# Altium footprint library PcbLib.PcbLib: 428 footprints (part 25 of 27)
Each footprint in its own frame and in the unit in brackets; x right, y up, seen from the top. Pads: shape width x height; smd on the part's side, far side on the other; paste and mask are expansions set on the pad; w line width, h text height; cw(c..) or ccw(c..) is an arc to the next point about the centre after c.
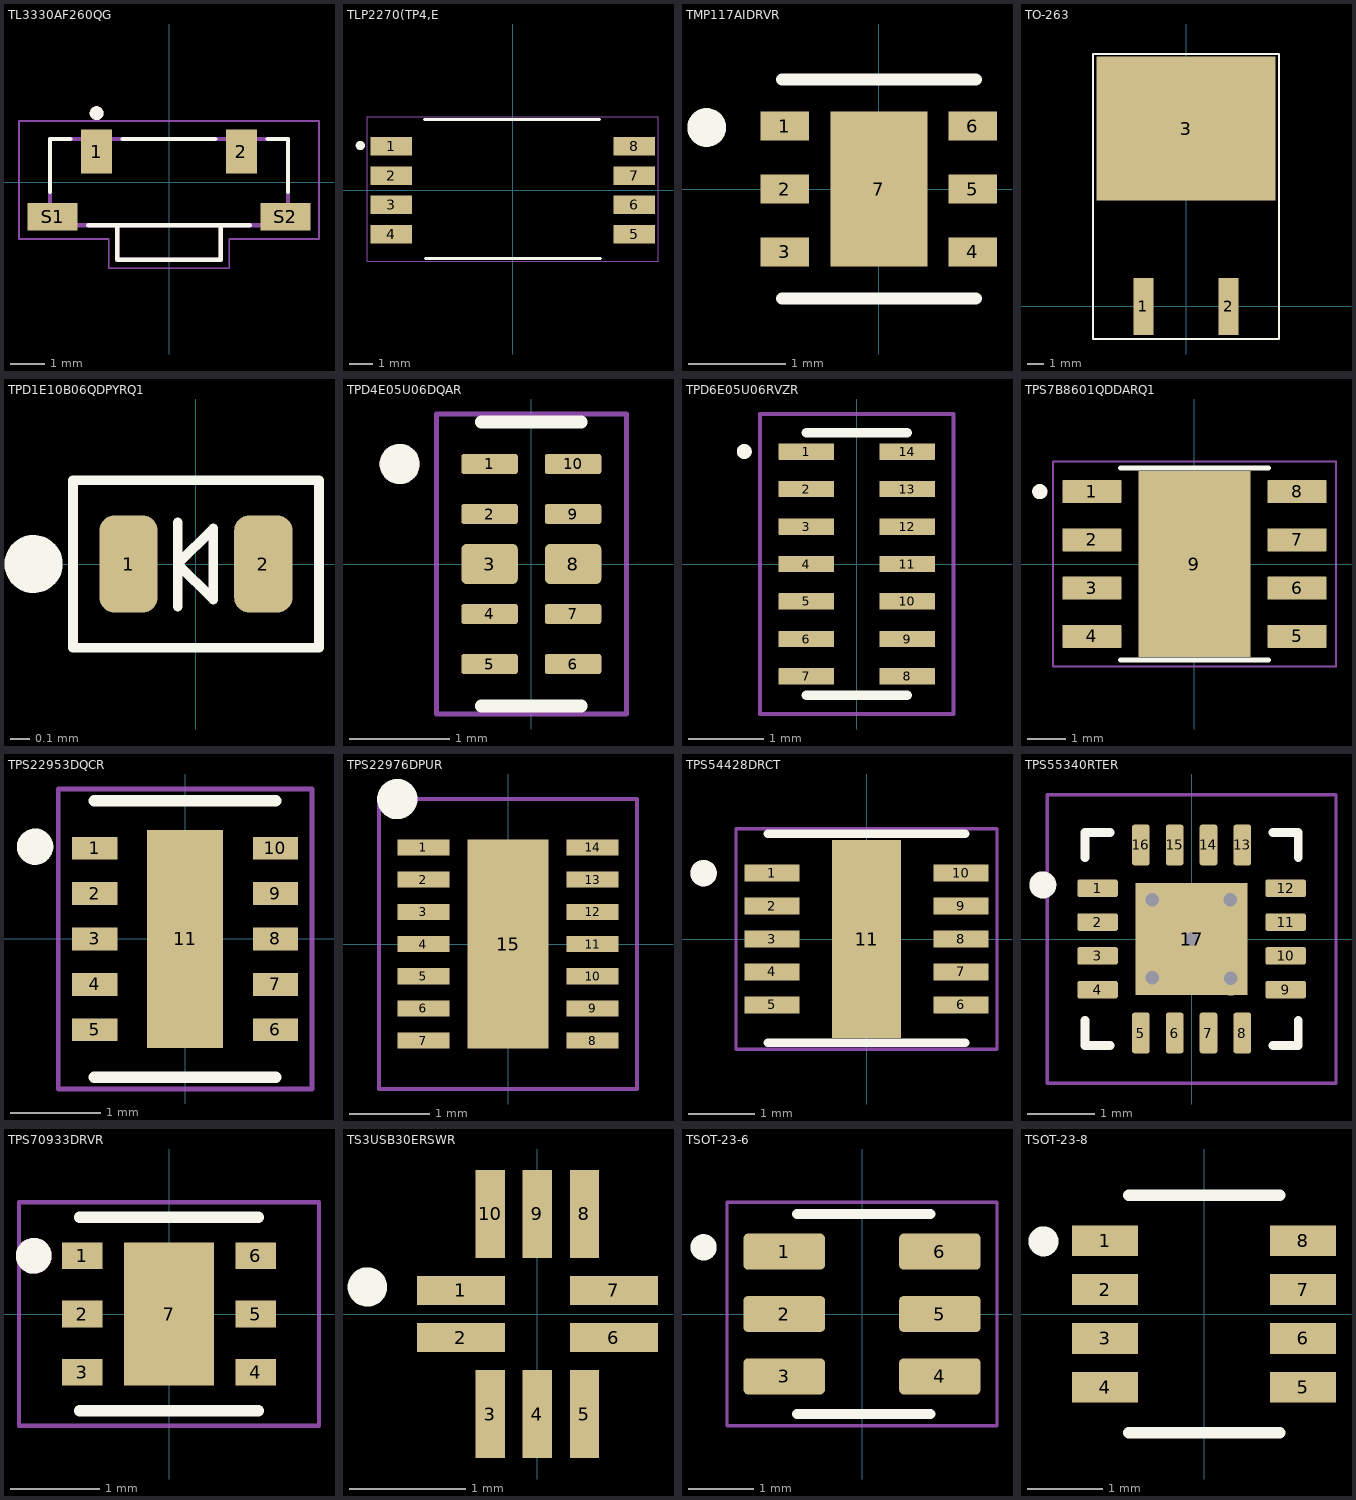
[diagram p24: the footprints below, top view; thin cyan lines are the x and y axes]

## TL3330AF260QG [mm]
height 3.4
pads (4):
  rect 0.9x1.27 smd: 1(-2.1,0.885) 2(2.1,0.885)
  rect 1.45x0.8 smd: S1(-3.375,-1) S2(3.375,-1)
Top Overlay:
  circle w0.2: c-2.1,2 r0.1
  lines w0.127: -3.45,-0.286 -3.45,1.25 -2.863,1.25 ; -2.337,-1.25 -1.5,-1.25 ; -1.336,1.25 1.336,1.25 ; 2.337,-1.25 1.5,-1.25 ; 2.863,1.25 3.45,1.25 3.45,-0.286 ; -1.5,-1.25 -1.5,-2.25 1.5,-2.25 1.5,-1.25 ; -1.5,-1.25 1.5,-1.25
Mechanical 13:
  circle w0.2: c-2.1,2 r0.1
  lines w0.127: -1.5,-1.25 -1.5,-2.25 1.5,-2.25 1.5,-1.25 ; -1.5,-1.25 1.5,-1.25 ; -1.5,-1.25 -3.45,-1.25 -3.45,1.25 3.45,1.25 3.45,-1.25 1.5,-1.25
Mechanical 15:
  lines w0.05: -4.35,-1.65 -1.75,-1.65 -1.75,-2.5 1.75,-2.5 1.75,-1.65 4.35,-1.65 4.35,1.77 -4.35,1.77 -4.35,-1.65
3D body "step_temp.STEP": height 3.5, standoff 0, extent -3.9,-2.25 3.9,1.259

## TLP2270(TP4,E [mm]
pads (8):
  rect 1.8x0.8 smd: 1(-5.275,1.905) 2(-5.275,0.635) 3(-5.275,-0.635) 4(-5.275,-1.905) 5(5.275,-1.905) 6(5.275,-0.635) 7(5.275,0.635) 8(5.275,1.905)
Top Overlay:
  circle w0.2: c-6.61,1.94 r0.1
  lines w0.127: -3.83,3.06 3.77,3.06 ; -3.79,-2.95 3.81,-2.95
Mechanical 15:
  lines w0.05: -6.31,-3.08 -6.31,3.19 6.3,3.19 6.3,-3.08 -6.31,-3.08
3D body "TLP2270_TP4,E.stp": height 2.2, standoff 0, extent -5.475,-2.875 5.575,2.975

## TMP117AIDRVR [mm]
pads (7):
  rect 0.5x0.3 smd: 1(-0.97,0.65) 2(-0.97,0) 3(-0.97,-0.65) 4(0.97,-0.65) 5(0.97,0) 6(0.97,0.65)
  rect 1x1.6 smd paste-2: 7(0,0)
Top Overlay:
  circle w0.2: c-1.778,0.635 r0.1
  lines w0.127: -1,-1.13 1,-1.13 ; -1,1.13 1,1.13
Top Paste:
  region: 0.316,-0.506 -0.316,-0.506 -0.316,0.506 0.316,0.506
3D body "step_temp.STEP": height 0.8, standoff 0, extent -1,-1 1,1

## TO-263 [mm]
pads (3):
  rect 1.2x3.4 smd: 1(-2.54,0) 2(2.54,0)
  rect 10.7x8.6 smd: 3(0,10.6)
Top Overlay:
  lines w0.127: -5.55,-1.95 5.55,-1.95 5.55,15.05 -5.55,15.05 -5.55,-1.95
3D body "IRF1407STRLPBF.STEP": height 4.83, standoff -0.25, extent -5.03,-0.635 5.13,14.605

## TPD1E10B06QDPYRQ1 [mm]
pads (2):
  rrect50% 0.3x0.5 smd paste-0.015 mask+0.07: 1(-0.348,0) 2(0.348,0)
Top Overlay:
  circle w0.15: c-0.838,0 r0.075
  lines w0.05: -0.094,-0.22 -0.094,0.216 ; -0.635,-0.432 0.635,-0.432 0.635,0.432 -0.635,0.432 -0.635,-0.432 ; -0.094,0 0.09,0.184 0.09,-0.184 -0.094,0
3D body "step_temp.STEP": height 0.45, standoff 0, extent -0.5,-0.3 0.5,0.3

## TPD4E05U06DQAR [mm]
height 0.55
pads (10):
  rrect25% 0.565x0.2 smd: 1(-0.417,1) 2(-0.417,0.5) 4(-0.417,-0.5) 5(-0.417,-1) 6(0.417,-1) 7(0.417,-0.5) 9(0.417,0.5) 10(0.417,1)
  rrect25% 0.565x0.4 smd: 3(-0.417,0) 8(0.417,0)
Top Overlay:
  circle w0.2: c-1.318,1 r0.1
  lines w0.127: -0.5,-1.42 0.5,-1.42 ; -0.5,1.42 0.5,1.42
Mechanical 13:
  circle w0.2: c-1.318,1 r0.1
Mechanical 15:
  lines w0.05: -0.95,-1.5 0.95,-1.5 0.95,1.5 -0.95,1.5 -0.95,-1.5
3D body "step_temp.STEP": height 0.55, standoff 0, extent -0.5,-1.25 0.5,1.25

## TPD6E05U06RVZR [mm]
pads (14):
  rrect6% 0.74x0.22 smd: 1(-0.67,1.5) 2(-0.67,1) 3(-0.67,0.5) 4(-0.67,0) 5(-0.67,-0.5) 6(-0.67,-1) 7(-0.67,-1.5) 8(0.67,-1.5) 9(0.67,-1) 10(0.67,-0.5) 11(0.67,0) 12(0.67,0.5) 13(0.67,1) 14(0.67,1.5)
Top Overlay:
  circle w0.1: c-1.5,1.5 r0.05
  lines w0.127: -0.675,-1.75 0.675,-1.75 ; -0.675,1.75 0.675,1.75
Mechanical 15:
  lines w0.05: -1.29,-2 1.29,-2 1.29,2 -1.29,2 -1.29,-2
3D body "step_temp.STEP": height 0.55, standoff 0, extent -0.675,-1.75 0.675,1.75

## TPS7B8601QDDARQ1 [mm]
pads (9):
  rrect5% 1.55x0.6 smd mask+0: 1(-2.7,1.905) 2(-2.7,0.635) 3(-2.7,-0.635) 4(-2.7,-1.905) 5(2.7,-1.905) 6(2.7,-0.635) 7(2.7,0.635) 8(2.7,1.905)
  rect 2.95x4.9 smd paste-3 mask+0: 9(0,0)
Top Overlay:
  circle w0.2: c-4.07,1.905 r0.1
  lines w0.127: -1.95,-2.525 1.95,-2.525 ; -1.95,2.525 1.95,2.525
Top Paste:
  region: 1.355,-1.7 -1.355,-1.7 -1.355,1.7 1.355,1.7
Top Solder:
  drawing of 9 lines, arcs and shapes, not listed
Mechanical 15:
  lines w0.05: -3.725,-2.7 -3.725,2.7 3.725,2.7 3.725,-2.7 -3.725,-2.7
3D body "step_temp.STEP": height 1.7, standoff 0, extent -3,-2.45 3,2.45

## TPS22953DQCR [mm]
pads (11):
  rect 0.5x0.25 smd: 1(-0.995,1) 2(-0.995,0.5) 3(-0.995,0) 4(-0.995,-0.5) 5(-0.995,-1) 6(0.995,-1) 7(0.995,-0.5) 8(0.995,0) 9(0.995,0.5) 10(0.995,1)
  rect 0.84x2.4 smd paste-2: 11(0,0)
Top Overlay:
  circle w0.2: c-1.651,1.016 r0.1
  lines w0.127: -1,-1.52 1,-1.52 ; -1,1.52 1,1.52
Top Paste:
  region: 0.265,-0.76 -0.265,-0.76 -0.265,0.76 0.265,0.76
Mechanical 15:
  lines w0.05: -1.397,-1.651 -1.397,1.651 1.397,1.651 1.397,-1.651 -1.397,-1.651
3D body "TPS22953DQCR.STEP": height 0.8, standoff 0, extent -1,-1.501 1,1.499

## TPS22976DPUR [mm]
pads (15):
  rect 0.65x0.2 smd: 1(-1.05,1.2) 2(-1.05,0.8) 3(-1.05,0.4) 4(-1.05,0) 5(-1.05,-0.4) 6(-1.05,-0.8) 7(-1.05,-1.2) 8(1.05,-1.2) 9(1.05,-0.8) 10(1.05,-0.4) 11(1.05,0) 12(1.05,0.4) 13(1.05,0.8) 14(1.05,1.2)
  rect 1x2.6 smd: 15(0,0)
Top Overlay:
  circle w0.25: c-1.375,1.8 r0.125
Mechanical 15:
  lines w0.05: -1.6,-1.8 -1.6,1.8 1.6,1.8 1.6,-1.8 -1.6,-1.8
3D body "TPS22976DPUR.stp": height 0.8, standoff 0, extent -1.05,-1.5 1.05,1.5

## TPS54428DRCT [mm]
pads (11):
  rect 0.84x0.26 smd: 1(-1.435,1) 2(-1.435,0.5) 3(-1.435,0) 4(-1.435,-0.5) 5(-1.435,-1) 6(1.435,-1) 7(1.435,-0.5) 8(1.435,0) 9(1.435,0.5) 10(1.435,1)
  rect 1.05x3.01 smd paste-3: 11(0,0)
Top Overlay:
  circle w0.2: c-2.475,1 r0.1
  lines w0.127: -1.501,-1.575 1.499,-1.575 ; -1.501,1.6 1.499,1.6
Top Paste:
  region: 0.33,-0.95 -0.33,-0.95 -0.33,0.95 0.33,0.95
Mechanical 13:
  circle w0.2: c-2.475,1 r0.1
Mechanical 15:
  lines w0.05: -1.981,-1.676 -1.981,1.676 1.981,1.676 1.981,-1.676 -1.981,-1.676
3D body "step_temp.STEP": height 1, standoff 0, extent -1.5,-1.5 1.5,1.5

## TPS55340RTER [mm]
pads (17):
  rrect25% 0.6x0.26 smd: 1(-1.39,0.75) 2(-1.39,0.25) 3(-1.39,-0.25) 4(-1.39,-0.75) 9(1.39,-0.75) 10(1.39,-0.25) 11(1.39,0.25) 12(1.39,0.75)
  rrect25% 0.26x0.6 smd: 5(-0.75,-1.39) 6(-0.25,-1.39) 7(0.25,-1.39) 8(0.75,-1.39) 13(0.75,1.39) 14(0.25,1.39) 15(-0.25,1.39) 16(-0.75,1.39)
  rect 1.66x1.66 smd paste-0.31: 17(0,0)
via 0,0 diameter 0.5 hole 0.2
via 0.571,0.577 diameter 0.5 hole 0.2
via -0.579,0.577 diameter 0.5 hole 0.2
via -0.582,-0.576 diameter 0.5 hole 0.2
via 0.578,-0.583 diameter 0.5 hole 0.2
Top Overlay:
  circle w0.2: c-2.2,0.8 r0.1
  lines w0.127: -1.575,-1.2 -1.575,-1.575 -1.2,-1.575 ; -1.575,1.2 -1.575,1.575 -1.2,1.575 ; 1.2,-1.575 1.575,-1.575 1.575,-1.2 ; 1.2,1.575 1.575,1.575 1.575,1.2
Mechanical 15:
  lines w0.05: -2.135,-2.135 2.135,-2.135 2.135,2.135 -2.135,2.135 -2.135,-2.135
3D body "step_temp.STEP": height 0.8, standoff 0, extent -1.5,-1.5 1.5,1.5

## TPS70933DRVR [mm]
pads (7):
  rect 0.45x0.3 smd: 1(-0.97,0.65) 2(-0.97,0) 3(-0.97,-0.65) 4(0.97,-0.65) 5(0.97,0) 6(0.97,0.65)
  rect 1x1.6 smd paste-2: 7(0,0)
Top Overlay:
  circle w0.2: c-1.51,0.65 r0.1
  lines w0.127: -1,-1.08 1,-1.08 ; -1,1.08 1,1.08
Top Paste:
  region: 0.316,-0.506 -0.316,-0.506 -0.316,0.506 0.316,0.506
Mechanical 13:
  circle w0.2: c-1.51,0.65 r0.1
Mechanical 15:
  lines w0.05: -1.675,-1.25 1.675,-1.25 1.675,1.25 -1.675,1.25 -1.675,-1.25
3D body "TPS70933DRVR.STEP": height 0.8, standoff 0, extent -1,-1 1,1

## TS3USB30ERSWR [mil]
pads (10):
  rect 30x10 smd: 1(-26,8) 2(-26,-8) 6(26,-8) 7(26,8)
  rect 10x30 smd: 3(-16,-34) 4(0,-34) 5(16,-34) 8(16,34) 9(0,34) 10(-16,34)
Top Overlay:
  circle w7: c-57.8,9.2 r3.2
3D body "TS3USB30ERSWR.STEP": height 21.65, standoff 0, extent -27.56,-35 27.56,35.87

## TSOT-23-6 [mm]
height 1
pads (6):
  rrect25% 1.24x0.55 smd: 1(-1.185,0.95) 2(-1.185,0) 3(-1.185,-0.95) 4(1.185,-0.95) 5(1.185,0) 6(1.185,0.95)
Top Overlay:
  circle w0.2: c-2.413,1.016 r0.1
  lines w0.152: -0.991,-1.524 1.041,-1.524 ; -0.991,1.524 1.041,1.524
Mechanical 15:
  lines w0.05: -2.055,-1.7 -2.055,1.7 2.055,1.7 2.055,-1.7 -2.055,-1.7
3D body "LTC6992IS6-2_TRMPBF.step": height 1, standoff 0, extent -1.4,-1.45 1.4,1.45

## TSOT-23-8 [mil]
pads (8):
  rect 34.5x16 smd paste+0 mask+0: 1(-51.75,38.39) 2(-51.75,12.8) 3(-51.75,-12.8) 4(-51.75,-38.39) 5(51.75,-38.39) 6(51.75,-12.8) 7(51.75,12.8) 8(51.75,38.39)
Top Overlay:
  circle w7.87: c-84,38 r3.94
  lines w6: -39.5,-62 39.5,-62 ; -39.5,62 39.5,62
3D body "TSOT-23_TS8_LIT.step": height 39.09, standoff 0, extent -55,-57.01 55,57.01